# Altium footprint library IMR_Lib - Copy.PcbLib: 50 footprints (part 3 of 4)
Each footprint in its own frame and in the unit in brackets; x right, y up, seen from the top. Pads: shape width x height; smd on the part's side, far side on the other; paste and mask are expansions set on the pad; w line width, h text height; cw(c..) or ccw(c..) is an arc to the next point about the centre after c.
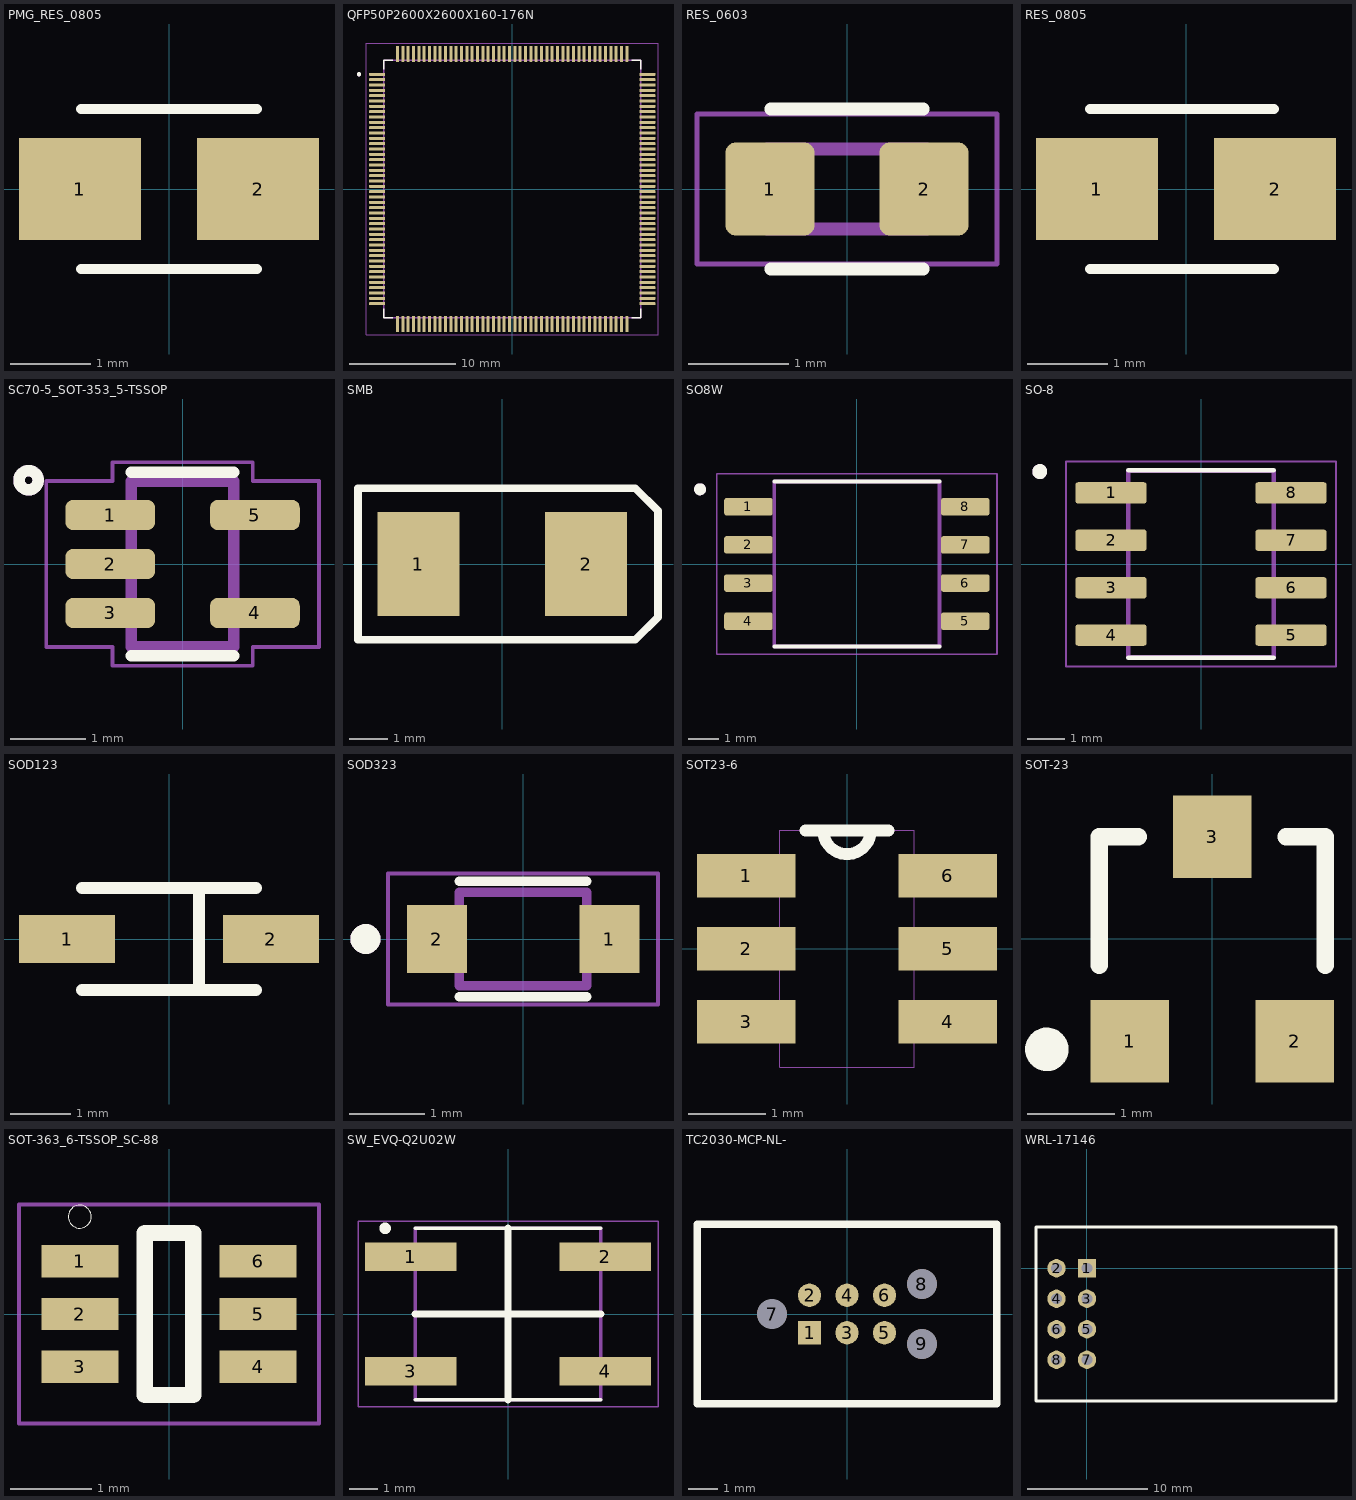
[diagram p2: the footprints below, top view; thin cyan lines are the x and y axes]

## PMG_RES_0805 [mil] "RES 0805"
pads (2):
  rect 60x50 smd: 1(-43.78,0) 2(43.78,0)
Top Overlay:
  lines w5: -43.31,-39.37 43.31,-39.37 ; -43.31,39.37 43.31,39.37
3D body "RES_0805.step": height 29.92, standoff 0, extent -45.27,-26.57 45.28,26.58
3D body: height 53.15, standoff -53.15, extent -9.84,88.58 -9.84,88.58
3D body: height 43.31, standoff 0, extent -39.37,118.11 -39.37,118.11

## QFP50P2600X2600X160-176N [mm]
pads (176):
  rrect25% 1.49x0.28 smd: 1(-12.67,10.75) 2(-12.67,10.25) 3(-12.67,9.75) 4(-12.67,9.25) 5(-12.67,8.75) 6(-12.67,8.25) 7(-12.67,7.75) 8(-12.67,7.25) 9(-12.67,6.75) 10(-12.67,6.25) 11(-12.67,5.75) 12(-12.67,5.25) 13(-12.67,4.75) 14(-12.67,4.25) 15(-12.67,3.75) 16(-12.67,3.25) 17(-12.67,2.75) 18(-12.67,2.25) 19(-12.67,1.75) 20(-12.67,1.25) 21(-12.67,0.75) 22(-12.67,0.25) 23(-12.67,-0.25) 24(-12.67,-0.75) 25(-12.67,-1.25) 26(-12.67,-1.75) 27(-12.67,-2.25) 28(-12.67,-2.75) 29(-12.67,-3.25) 30(-12.67,-3.75) 31(-12.67,-4.25) 32(-12.67,-4.75) 33(-12.67,-5.25) 34(-12.67,-5.75) 35(-12.67,-6.25) 36(-12.67,-6.75) 37(-12.67,-7.25) 38(-12.67,-7.75) 39(-12.67,-8.25) 40(-12.67,-8.75) 41(-12.67,-9.25) 42(-12.67,-9.75) 43(-12.67,-10.25) 44(-12.67,-10.75) 89(12.67,-10.75) 90(12.67,-10.25) 91(12.67,-9.75) 92(12.67,-9.25) 93(12.67,-8.75) 94(12.67,-8.25) 95(12.67,-7.75) 96(12.67,-7.25) 97(12.67,-6.75) 98(12.67,-6.25) 99(12.67,-5.75) 100(12.67,-5.25) 101(12.67,-4.75) 102(12.67,-4.25) 103(12.67,-3.75) 104(12.67,-3.25) 105(12.67,-2.75) 106(12.67,-2.25) 107(12.67,-1.75) 108(12.67,-1.25) 109(12.67,-0.75) 110(12.67,-0.25) 111(12.67,0.25) 112(12.67,0.75) 113(12.67,1.25) 114(12.67,1.75) 115(12.67,2.25) 116(12.67,2.75) 117(12.67,3.25) 118(12.67,3.75) 119(12.67,4.25) 120(12.67,4.75) 121(12.67,5.25) 122(12.67,5.75) 123(12.67,6.25) 124(12.67,6.75) 125(12.67,7.25) 126(12.67,7.75) 127(12.67,8.25) 128(12.67,8.75) 129(12.67,9.25) 130(12.67,9.75) 131(12.67,10.25) 132(12.67,10.75)
  rrect25% 0.28x1.49 smd: 45(-10.75,-12.67) 46(-10.25,-12.67) 47(-9.75,-12.67) 48(-9.25,-12.67) 49(-8.75,-12.67) 50(-8.25,-12.67) 51(-7.75,-12.67) 52(-7.25,-12.67) 53(-6.75,-12.67) 54(-6.25,-12.67) 55(-5.75,-12.67) 56(-5.25,-12.67) 57(-4.75,-12.67) 58(-4.25,-12.67) 59(-3.75,-12.67) 60(-3.25,-12.67) 61(-2.75,-12.67) 62(-2.25,-12.67) 63(-1.75,-12.67) 64(-1.25,-12.67) 65(-0.75,-12.67) 66(-0.25,-12.67) 67(0.25,-12.67) 68(0.75,-12.67) 69(1.25,-12.67) 70(1.75,-12.67) 71(2.25,-12.67) 72(2.75,-12.67) 73(3.25,-12.67) 74(3.75,-12.67) 75(4.25,-12.67) 76(4.75,-12.67) 77(5.25,-12.67) 78(5.75,-12.67) 79(6.25,-12.67) 80(6.75,-12.67) 81(7.25,-12.67) 82(7.75,-12.67) 83(8.25,-12.67) 84(8.75,-12.67) 85(9.25,-12.67) 86(9.75,-12.67) 87(10.25,-12.67) 88(10.75,-12.67) 133(10.75,12.67) 134(10.25,12.67) 135(9.75,12.67) 136(9.25,12.67) 137(8.75,12.67) 138(8.25,12.67) 139(7.75,12.67) 140(7.25,12.67) 141(6.75,12.67) 142(6.25,12.67) 143(5.75,12.67) 144(5.25,12.67) 145(4.75,12.67) 146(4.25,12.67) 147(3.75,12.67) 148(3.25,12.67) 149(2.75,12.67) 150(2.25,12.67) 151(1.75,12.67) 152(1.25,12.67) 153(0.75,12.67) 154(0.25,12.67) 155(-0.25,12.67) 156(-0.75,12.67) 157(-1.25,12.67) 158(-1.75,12.67) 159(-2.25,12.67) 160(-2.75,12.67) 161(-3.25,12.67) 162(-3.75,12.67) 163(-4.25,12.67) 164(-4.75,12.67) 165(-5.25,12.67) 166(-5.75,12.67) 167(-6.25,12.67) 168(-6.75,12.67) 169(-7.25,12.67) 170(-7.75,12.67) 171(-8.25,12.67) 172(-8.75,12.67) 173(-9.25,12.67) 174(-9.75,12.67) 175(-10.25,12.67) 176(-10.75,12.67)
Top Overlay:
  circle w0.2: c-14.36,10.75 r0.1
  lines w0.127: -12.05,-11.21 -12.05,-12.05 -11.21,-12.05 ; -12.05,11.21 -12.05,12.05 -11.21,12.05 ; 11.21,-12.05 12.05,-12.05 12.05,-11.21 ; 11.21,12.05 12.05,12.05 12.05,11.21
Mechanical 13:
  circle w0.2: c-14.36,10.75 r0.1
  lines w0.127: -12.05,-12.05 -12.05,12.05 12.05,12.05 12.05,-12.05 -12.05,-12.05
Mechanical 15:
  lines w0.05: -13.665,-13.665 -13.665,13.665 13.665,13.665 13.665,-13.665 -13.665,-13.665
3D body "LQFP176-0_5.step": height 1.55, standoff -0.02, extent -12.886,-12.886 12.886,12.886

## RES_0603 [mm] "RES 0603 .125W"
height 0.9
pads (2):
  rrect22% 0.89x0.93 smd: 1(-0.77,0) 2(0.77,0)
Top Overlay:
  lines w0.127: -0.762,-0.8 0.762,-0.8 ; -0.762,0.8 0.762,0.8
Mechanical 13:
  lines w0.127: -0.8,-0.4 0.8,-0.4 0.8,0.4 -0.8,0.4 -0.8,-0.4
Mechanical 15:
  lines w0.05: -1.5,-0.75 1.5,-0.75 1.5,0.75 -1.5,0.75 -1.5,-0.75
3D body "RES_0603.STEP": height 0.53, standoff 0.02, extent -0.8,-0.43 0.8,0.43

## RES_0805 [mil]
pads (2):
  rect 60x50 smd: 1(-43.78,0) 2(43.78,0)
Top Overlay:
  lines w5: -47.24,-39.37 43.31,-39.37 ; -47.24,39.37 43.31,39.37
3D body "RES_0805.step": height 29.92, standoff 0, extent -45.27,-26.57 45.28,26.58
3D body: height 43.31, standoff 0, extent -39.37,118.11 -39.37,118.11

## SC70-5_SOT-353_5-TSSOP [mm] "COMMON NAMES: SC70-5, SOT-353, 5-TSSOP"
height 1.2
pads (5):
  rrect50% 1.19x0.4 smd: 1(-0.96,0.65) 2(-0.96,0) 3(-0.96,-0.65) 4(0.96,-0.65) 5(0.96,0.65)
Top Overlay:
  lines w0.152: -0.68,-1.219 0.68,-1.219 ; -0.68,1.219 0.68,1.219 ; -2.044,0.985 ccw(c-2.044,1.112) -2.044,1.239 ccw(c-2.044,1.112) -2.044,0.985
Mechanical 13:
  lines w0.152: -2.044,0.985 cw(c-2.044,1.112) -2.044,1.239 cw(c-2.044,1.112) -2.044,0.985 ; -0.68,-1.1 0.68,-1.1 0.68,1.1 -0.68,1.1 -0.68,-1.1
Mechanical 15:
  lines w0.05: -1.81,-1.1 -1.81,1.1 -0.93,1.1 -0.93,1.35 0.93,1.35 0.93,1.1 1.81,1.1 1.81,-1.1 0.93,-1.1 0.93,-1.35 -0.93,-1.35 -0.93,-1.1 -1.81,-1.1
3D body "SC70-5_SOT-353_5-TSSOP.STEP": height 0.98, standoff 0.01, extent -1.1,-1 1.1,1

## SMB [mm] "DIODE SCHOTTKY 40V 1A SMB"
height 1.95
pads (2):
  rect 2.159x2.743 smd: 1(-2.21,0) 2(2.21,0)
Top Overlay:
  lines w0.2: -3.8,-2 -3.8,2 3.5,2 4.1,1.4 4.1,-1.4 3.5,-2 -3.8,-2
3D body "SMB.step": height 2.44, standoff -0.01, extent -2.795,-1.84 2.795,2.1

## SO8W [mm] "8 Pin SOP2 (SO8W) 5mm x 5mm"
height 1.91
pads (8):
  rrect25% 1.61x0.58 smd: 1(-3.605,1.905) 2(-3.605,0.635) 3(-3.605,-0.635) 4(-3.605,-1.905) 5(3.605,-1.905) 6(3.605,-0.635) 7(3.605,0.635) 8(3.605,1.905)
Top Overlay:
  circle w0.2: c-5.215,2.485 r0.1
  lines w0.127: -2.745,-2.745 2.745,-2.745 ; -2.745,2.745 2.745,2.745
Mechanical 13:
  circle w0.2: c-5.215,2.485 r0.1
  lines w0.127: -2.745,-2.745 2.745,-2.745 2.745,2.745 -2.745,2.745 -2.745,-2.745
Mechanical 15:
  lines w0.05: -4.66,-2.995 4.66,-2.995 4.66,2.995 -4.66,2.995 -4.66,-2.995
3D body "SOIC8_WIDE.step": height 1.75, standoff -0.01, extent -4.051,-2.73 4.05,2.73

## SO-8 [mm] "SO8 IC"
height 1.45
pads (8):
  rrect25% 1.91x0.57 smd: 1(-2.41,1.905) 2(-2.41,0.635) 3(-2.41,-0.635) 4(-2.41,-1.905) 5(2.41,-1.905) 6(2.41,-0.635) 7(2.41,0.635) 8(2.41,1.905)
Top Overlay:
  circle w0.2: c-4.32,2.475 r0.1
  lines w0.127: -1.95,-2.51 1.95,-2.51 ; -1.95,2.51 1.95,2.51
Mechanical 13:
  circle w0.2: c-4.32,2.475 r0.1
  lines w0.127: -1.95,-2.5 1.95,-2.5 1.95,2.5 -1.95,2.5 -1.95,-2.5
Mechanical 15:
  lines w0.05: -3.615,-2.75 3.615,-2.75 3.615,2.75 -3.615,2.75 -3.615,-2.75
3D body "SOIC8.step": height 1.75, standoff -0.01, extent -3.1,-2.5 3.1,2.5

## SOD123 [mm] "SOD123"
height 1.35
pads (2):
  rect 1.6x0.8 smd: 1(-1.7,0) 2(1.7,0)
Top Overlay:
  lines w0.2: -1.45,-0.85 1.45,-0.85 ; -1.45,0.85 1.45,0.85 ; 0.5,-0.85 0.5,0.85
3D body "SOD123.STEP": height 1.27, standoff 0, extent -1.85,-0.8 1.85,0.8

## SOD323 [mm] "SOD323"
height 1.15
pads (2):
  rect 0.8x0.9 smd: 1(1.15,0) 2(-1.15,0)
Top Overlay:
  circle w0.2: c-2.1,0 r0.1
  lines w0.127: -0.85,-0.77 0.85,-0.77 ; -0.85,0.77 0.85,0.77
Mechanical 13:
  circle w0.2: c-2.1,0 r0.1
  lines w0.127: -0.85,-0.625 -0.85,0.625 0.85,0.625 0.85,-0.625 -0.85,-0.625
Mechanical 15:
  lines w0.05: -1.8,-0.875 1.8,-0.875 1.8,0.875 -1.8,0.875 -1.8,-0.875
3D body "SOD323.STEP": height 1.1, standoff 0, extent -1.3,-0.675 1.3,0.675

## SOT23-6 [mil] "SOT23-6"
height 59.06
pads (6):
  rect 50x22 smd: 1(-51,37) 2(-51,0) 3(-51,-37) 4(51,-37) 5(51,0) 6(51,37)
Top Overlay:
  lines w6: -21,60 -12,60 ; 21,60 12,60 ; -12,60 ccw(c0,60) 12,60 ; -12,60 12,60
Mechanical 13:
  lines w0: -34,-47 -59,-47 -59,-28 -34,-28 ; -34,-47 -34,-28 ; -34,-47 -34,-60 34,-60 34,-47 ; -34,-28 -34,-10 ; -34,-10 -59,-10 -59,10 -34,10 ; -34,-10 -34,10 ; -34,10 -34,28 ; -34,28 -59,28 -59,47 -34,47 ; -34,28 -34,47 ; -34,47 -34,60 -12,60 ; -12,60 ccw(c0,60) 12,60 ; -12,60 12,60 ; 12,60 34,60 34,47 ; 34,-47 59,-47 59,-28 34,-28 ; 34,-47 34,-28 ; 34,-28 34,-10 ; 34,-10 59,-10 59,10 34,10 ; 34,-10 34,10 ; 34,10 34,28 ; 34,28 59,28 59,47 34,47 ; 34,28 34,47
3D body "SOT23-6.step": height 57.09, standoff 0, extent -55.11,-57.09 55.12,57.09
3D body: height 39.37, standoff 0, extent 19.68,127.95 19.68,127.95

## SOT-23 [mm] "SOT23-3"
height 1.1
pads (3):
  rect 0.9x0.95 smd: 1(-0.95,-1.175) 2(0.95,-1.175) 3(0,1.175)
Top Overlay:
  circle w0.25: c-1.903,-1.27 r0.125
  lines w0.2: -1.3,-0.3 -1.3,1.175 -0.85,1.175 ; 0.85,1.175 1.3,1.175 1.3,-0.3
3D body "SOT-23.STEP": height 1.1, standoff 0, extent -1.4,-1.15 1.6,1.35

## SOT-363_6-TSSOP_SC-88 [mm] "COMMON NAMES: SOT-363, 6-TSSOP, SC-88"
height 1.2
pads (6):
  rect 0.95x0.4 smd: 1(-1.1,0.65) 2(-1.1,0) 3(-1.1,-0.65) 4(1.1,-0.65) 5(1.1,0) 6(1.1,0.65)
Top Overlay:
  circle w0: c-1.1,1.2 r0.141
  lines w0.2: -0.3,-1 0.3,-1 0.3,1 -0.3,1 -0.3,-1
Mechanical 15:
  lines w0.05: -1.85,-1.35 1.85,-1.35 1.85,1.35 -1.85,1.35 -1.85,-1.35
3D body "SOT363-6.step": height 1.1, standoff 0, extent -1.2,-1.1 1.2,1.1

## SW_EVQ-Q2U02W [mm] "SWITCH"
height 2.25
pads (4):
  rect 3.2x1 smd: 1(-3.4,2) 2(3.4,2) 3(-3.4,-2) 4(3.4,-2)
Top Overlay:
  circle w0.2: c-4.3,3 r0.1
  lines w0.127: -3.25,-3 3.25,-3 ; -3.25,3 3.25,3
  lines w0.254: -3.25,0 3.25,0 ; 0,-3 0,3
Mechanical 13:
  lines w0.127: -3.25,-3 -3.25,3 3.25,3 3.25,-3 -3.25,-3
Mechanical 15:
  lines w0.05: -5.25,-3.25 -5.25,3.25 5.25,3.25 5.25,-3.25 -5.25,-3.25
3D body: height 2.3, standoff 1.8, extent -1.9,-1.897 1.9,1.897
3D body: height 1.8, standoff 0, extent -3.25,-3 3.25,3

## TC2030-MCP-NL- [mm] "CABLE TAG-CONNECT IN-CIRCUIT"
pads (9):
  rect 0.787x0.787 smd: 1(-1.27,-0.635)
  round 0.787 smd: 2(-1.27,0.635) 3(0,-0.635) 4(0,0.635) 5(1.27,-0.635) 6(1.27,0.635)
  oval 1x0.991 hole 1 unplated: 7(-2.54,0)
  round 1 hole 1 unplated: 8(2.54,1.016) 9(2.54,-1.016)
Top Overlay:
  lines w0.254: -5.08,-3.048 -5.08,3.048 5.08,3.048 5.08,-3.048 -5.08,-3.048

## WRL-17146 [mil] "ESP8266 WIFI MODULE"
height 78.74
pads (8):
  rect 60x60 hole 35: 1(0,0)
  round 60 hole 35: 2(-100,0) 3(0,-100) 4(-100,-100) 5(0,-200) 6(-100,-200) 7(0,-300) 8(-100,-300)
Top Overlay:
  lines w10: -167.32,-435.43 816.93,-435.43 816.93,135.43 -167.32,135.43 -167.32,-435.43
3D body "WRL-17146.step": height 231.4, standoff -228.35, extent -165.35,-433.07 811.02,137.8